# Altium footprint library YQPOWER.PcbLib: 215 footprints (part 1 of 14)
Each footprint in its own frame and in the unit in brackets; x right, y up, seen from the top. Pads: shape width x height; smd on the part's side, far side on the other; paste and mask are expansions set on the pad; w line width, h text height; cw(c..) or ccw(c..) is an arc to the next point about the centre after c.
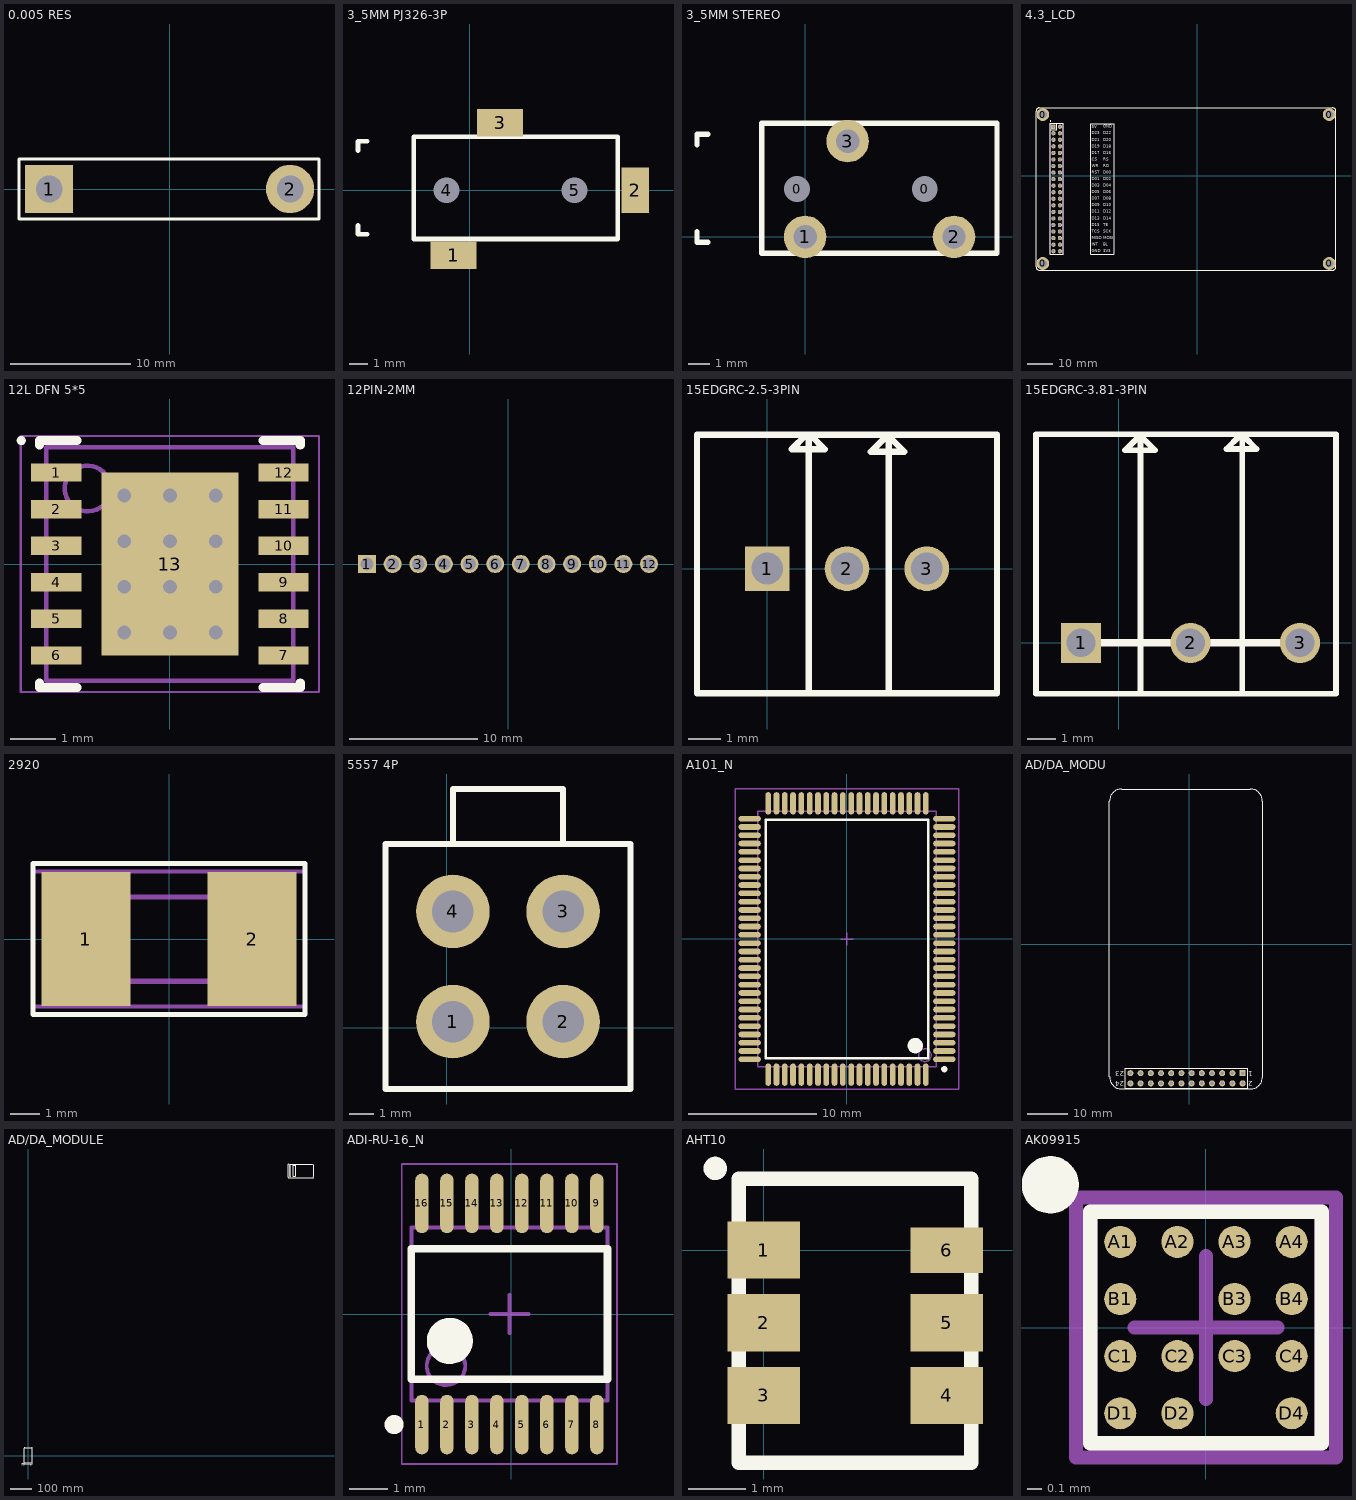
[diagram p0: the footprints below, top view; thin cyan lines are the x and y axes]

## 0.005 RES [mm]
pads (2):
  rect 4x4 hole 2.2: 1(-10,0)
  round 4 hole 2.2: 2(10,0)
Top Overlay:
  lines w0.254: -12.5,-2.5 12.4,-2.5 12.4,2.5 -12.5,2.5 -12.5,-2.5

## 3_5MM PJ326-3P [mil]
pads (5):
  rect 98.43x59.06 smd: 1(-35,-140) 3(65,145)
  rect 59.06x98.43 smd: 2(355,0)
  round 47 hole 55.12 unplated: 4(-50,0) 5(225,0)
Top Overlay:
  lines w10: -240.12,-75 -240.12,-95 -220.12,-95 ; -240.12,85 -240.12,105 -220.12,105 ; -120.12,-105 -120.12,-55 -120.12,115 48.62,115 317.81,115 317.81,-105 -120.12,-105

## 3_5MM STEREO [mm]
pads (5):
  round 0.8 hole 1.2: 0(-0.38,2.25) 0(5.62,2.25)
  round 2 hole 1.1: 1(0,0) 2(7,0) 3(2,4.5)
Top Overlay:
  lines w0.254: -5.08,0.254 -5.08,-0.254 -4.572,-0.254 ; -5.08,4.318 -5.08,4.826 -4.572,4.826 ; -2.032,5.334 -2.032,0.762 -2.032,-0.762 9.02,-0.762 9.02,0.632 9.02,4.5 9.02,5.334 2,5.334 -2.008,5.334

## 4.3_LCD [mm] "Connector; Header; 20x2 Position"
pads (48):
  round 0 hole 3: 0(-59.87,-34) 0(-59.87,23.7) 0(51.13,-34) 0(51.13,23.7)
  round 5 hole 3.2: 0(-59.87,-34) 0(-59.87,23.7) 0(51.13,-34) 0(51.13,23.7)
  rect 1.65x1.65 hole 1.016 mask+0: 1(-55.77,19)
  round 1.65 hole 1.016 mask+0: 2(-53.23,19) 3(-55.77,16.46) 4(-53.23,16.46) 5(-55.77,13.92) 6(-53.23,13.92) 7(-55.77,11.38) 8(-53.23,11.38) 9(-55.77,8.84) 10(-53.23,8.84) 11(-55.77,6.3) 12(-53.23,6.3) 13(-55.77,3.76) 14(-53.23,3.76) 15(-55.77,1.22) 16(-53.23,1.22) 17(-55.77,-1.32) 18(-53.23,-1.32) 19(-55.77,-3.86) 20(-53.23,-3.86) 21(-55.77,-6.4) 22(-53.23,-6.4) 23(-55.77,-8.94) 24(-53.23,-8.94) 25(-55.77,-11.48) 26(-53.23,-11.48) 27(-55.77,-14.02) 28(-53.23,-14.02) 29(-55.77,-16.56) 30(-53.23,-16.56) 31(-55.77,-19.1) 32(-53.23,-19.1) 33(-55.77,-21.64) 34(-53.23,-21.64) 35(-55.77,-24.18) 36(-53.23,-24.18) 37(-55.77,-26.72) 38(-53.23,-26.72) 39(-55.77,-29.26) 40(-53.23,-29.26)
Top Overlay:
  circle w0.25: c-56.9,21.17 r0.125
  lines w0.178: -57.04,17.73 -54.5,17.73 -54.5,20.27 ; -57.04,-30.53 -51.96,-30.53 -51.96,20.27 -57.04,20.27 -57.04,-30.53
  lines w0.2: -41.27,-30.5 -32.37,-30.5 -32.37,20.2 -41.27,20.2 -41.27,-30.5
  lines w0.254: -62.504,25 cw(c-61.17,25) -61.17,26.334 52.396,26.334 cw(c52.396,25) 53.73,25 53.73,-35.232 ; -62.47,24.966 -62.47,-35.3 ccw(c-61.136,-35.3) -61.136,-36.634 ; -61.102,-36.6 52.43,-36.6 ccw(c52.43,-35.266) 53.764,-35.266
  text "GND" at -40.978,-30.068 h2
  text "D15" at -40.978,-19.908 h2
  text "D07" at -40.978,-9.748 h2
  text "RST" at -40.978,0.412 h2
  text "D19" at -40.978,10.512 h2
  text "MISO" at -40.978,-24.988 h2
  text "INT" at -40.978,-27.528 h2
  text "D13" at -40.978,-17.368 h2
  text "TCS" at -40.97,-22.4 h2
  text "D09" at -40.978,-12.288 h2
  text "D11" at -40.978,-14.828 h2
  text "D01" at -40.978,-2.128 h2
  text "D03" at -40.978,-4.668 h2
  text "WR" at -40.978,2.952 h2
  text "CS" at -40.97,5.5 h2
  text "D23" at -40.978,15.592 h2
  text "D21" at -40.978,13.052 h2
  text "5V" at -40.97,18.1 h2
  text "D17" at -40.978,7.972 h2
  text "D05" at -40.978,-7.208 h2
  text "SCK" at -36.358,-22.448 h2
  text "D10" at -36.358,-12.288 h2
  text "D02" at -36.358,-2.128 h2
  text "D18" at -36.358,10.512 h2
  text "3V3" at -36.358,-30.068 h2
  text "BL" at -36.358,-27.528 h2
  text "D14" at -36.358,-17.368 h2
  text "TE" at -36.358,-19.908 h2
  text "D08" at -36.358,-9.748 h2
  text "D12" at -36.358,-14.828 h2
  text "D04" at -36.358,-4.668 h2
  text "D06" at -36.358,-7.208 h2
  text "RS" at -36.358,5.492 h2
  text "RD" at -36.358,2.952 h2
  text "D22" at -36.358,15.592 h2
  text "D20" at -36.358,13.052 h2
  text "GND" at -36.358,18.132 h2
  text "MOSI" at -36.358,-24.988 h2
  text "D16" at -36.358,7.972 h2
  text "D00" at -36.358,0.412 h2
Mechanical 5:
  region: -56.278,19.508 -56.278,18.492 -55.262,18.492 -55.262,19.508
  lines w0.127: -57.04,-30.53 -57.04,20.27 -51.96,20.27 -51.96,-30.53 -57.04,-30.53
  text ".Designator" at -55.008,-3.606 h1.02
3D body "SamtecTSW-07_20x2.stp": height 8.38, standoff -2.54, extent -57.04,-30.53 -51.96,20.27

## 12L DFN 5*5 [mm] "SON, 12-Leads, Body 5.00x5.35mm, Pitch 0.80mm, Thermal Pad 4.00x3.00mm, IPC Medium Density"
height 1
pads (13):
  rect 1.1x0.4 smd mask+0: 1(-2.485,2) 2(-2.485,1.2) 3(-2.485,0.4) 4(-2.485,-0.4) 5(-2.485,-1.2) 6(-2.485,-2) 7(2.485,-2) 8(2.485,-1.2) 9(2.485,-0.4) 10(2.485,0.4) 11(2.485,1.2) 12(2.485,2)
  rect 3x4 smd paste-1.5 mask+0: 13(0,0)
via -1,1.5 diameter 0.5 hole 0.3
via 0,1.5 diameter 0.5 hole 0.3
via 1,1.5 diameter 0.5 hole 0.3
via -1,0.5 diameter 0.5 hole 0.3
via 0,0.5 diameter 0.5 hole 0.3
via 1,0.5 diameter 0.5 hole 0.3
via -1,-0.5 diameter 0.5 hole 0.3
via 0,-0.5 diameter 0.5 hole 0.3
via 1,-0.5 diameter 0.5 hole 0.3
via -1,-1.5 diameter 0.5 hole 0.3
via 0,-1.5 diameter 0.5 hole 0.3
via 1,-1.5 diameter 0.5 hole 0.3
Top Overlay:
  circle w0.1: c-3.25,2.7 r0.05
  lines w0.2: -2.85,-2.6 -2.85,-2.7 -2.035,-2.7 ; -2.85,2.6 -2.85,2.7 -2.035,2.7 ; 2.035,-2.7 2.85,-2.7 2.85,-2.6 ; 2.035,2.7 2.85,2.7 2.85,2.6
Top Paste:
  rectangle: -1.4,0.765 -0.1,1.895
  rectangle: -1.4,-0.565 -0.1,0.565
  rectangle: -1.4,-1.895 -0.1,-0.765
  rectangle: 0.1,0.765 1.4,1.895
  rectangle: 0.1,-0.565 1.4,0.565
  rectangle: 0.1,-1.895 1.4,-0.765
Mechanical 13:
  circle w0.1: c-1.8,1.65 r0.5
  lines w0.1: -2.7,-2.55 -2.7,2.55 2.7,2.55 2.7,-2.55 -2.7,-2.55
Mechanical 15:
  lines w0.05: -3.26,-2.8 -3.26,2.8 3.26,2.8 3.26,-2.8 -3.26,-2.8
  lines w0.1: -0.5,0 0.5,0 ; 0,-0.5 0,0.5
3D body: height 1, standoff 0.1, extent -2.7,-2.55 2.7,2.55

## 12PIN-2MM [mm] "Samtec 100mil, 1x12, 230 mil above insulator"
height 8.382
pads (12):
  rect 1.4x1.4 hole 1 mask+0: 1(-11,0)
  round 1.4 hole 1 mask+0: 2(-9,0) 3(-7,0) 4(-5,0) 5(-3,0) 6(-1,0) 7(1,0) 8(3,0) 9(5,0) 10(7,0) 11(9,0) 12(11,0)

## 15EDGRC-2.5-3PIN [mm]
pads (3):
  rect 1.4x1.4 hole 1: 1(0,0)
  round 1.4 hole 1: 2(2.5,0) 3(5,0)
Top Overlay:
  lines w0.203: 1.295,-3.912 1.295,4.191 1.219,4.191 0.762,3.734 1.803,3.734 1.346,4.191 ; 3.708,4.115 3.251,3.658 4.293,3.658 3.835,4.115 ; 3.809,-3.835 3.809,4.2 ; -2.2,-3.9 7.2,-3.9 7.2,4.2 -2.2,4.2 -2.2,-3.9

## 15EDGRC-3.81-3PIN [mm]
pads (3):
  rect 1.4x1.4 hole 1: 1(-1.31,0)
  round 1.4 hole 1: 2(2.5,0) 3(6.31,0)
Top Overlay:
  lines w0.203: 0.756,-1.74 0.756,7.084 0.68,7.16 0.223,6.703 1.264,6.703 0.807,7.16 ; 4.209,7.207 3.752,6.75 4.794,6.75 4.336,7.207 ; 4.299,-1.69 4.299,7.207 ; -2.88,-1.77 -2.88,7.26 7.56,7.26 7.56,-1.77 -2.88,-1.77
  lines w0.254: -1.31,0 2.5,0 6.31,0

## 2920 [mm] "Cooper Bussman 6125FA Brick Fuses, recommended land pattern OC-2531 Rev. I 3/07"
height 2.84
pads (2):
  rect 3x4.5 smd: 1(-2.8,0) 2(2.8,0)
Top Overlay:
  lines w0.178: -4.575,-2.54 4.575,-2.54 4.575,2.54 -4.575,2.54 -4.575,-2.54
Mechanical 5:
  lines w0.127: -4.575,-2.275 -4.575,2.275 4.575,2.275 4.575,-2.25 4.55,-2.275 -4.575,-2.275
  text ".Designator" at -1.725,-0.525 h1.02
Mechanical 13:
  lines w0.178: -1.825,-1.425 -1.825,1.415 ; 1.825,-1.425 1.825,1.415 ; -3.175,-1.425 3.175,-1.425 3.175,1.415 -3.175,1.415 -3.175,-1.425
3D body: height 2.84, standoff 0, extent -3.174,-1.424 -1.826,1.414
3D body: height 2.84, standoff 0, extent -1.824,-1.424 1.824,1.414
3D body: height 2.84, standoff 0, extent 1.826,-1.424 3.174,1.414

## 5557 4P [mm] "Samtec 100mil, 1x4, 230 mil above insulator"
height 8.382
pads (4):
  round 3 hole 1.7: 1(0.25,0.25) 2(4.75,0.25) 3(4.75,4.75) 4(0.25,4.75)
Top Overlay:
  lines w0.254: 0.25,7.5 0.25,9.75 4.75,9.75 4.75,7.5 ; -2.5,-2.5 7.5,-2.5 7.5,7.5 -2.5,7.5 -2.5,-2.5

## A101_N [mm] "100pin"
pads (100):
  oval 1.75x0.45 smd: 1(7.641,-9.433) 2(7.641,-8.783) 3(7.641,-8.133) 4(7.641,-7.483) 5(7.641,-6.833) 6(7.641,-6.183) 7(7.641,-5.533) 8(7.641,-4.883) 9(7.641,-4.233) 10(7.641,-3.583) 11(7.641,-2.933) 12(7.641,-2.283) 13(7.641,-1.633) 14(7.641,-0.983) 15(7.641,-0.333) 16(7.641,0.317) 17(7.641,0.967) 18(7.641,1.617) 19(7.641,2.267) 20(7.641,2.917) 21(7.641,3.567) 22(7.641,4.217) 23(7.641,4.867) 24(7.641,5.517) 25(7.641,6.167) 26(7.641,6.817) 27(7.641,7.467) 28(7.641,8.117) 29(7.641,8.767) 30(7.641,9.417) 51(-7.609,9.417) 52(-7.609,8.767) 53(-7.609,8.117) 54(-7.609,7.467) 55(-7.609,6.817) 56(-7.609,6.167) 57(-7.609,5.517) 58(-7.609,4.867) 59(-7.609,4.217) 60(-7.609,3.567) 61(-7.609,2.917) 62(-7.609,2.267) 63(-7.609,1.617) 64(-7.609,0.967) 65(-7.609,0.317) 66(-7.609,-0.333) 67(-7.609,-0.983) 68(-7.609,-1.633) 69(-7.609,-2.283) 70(-7.609,-2.933) 71(-7.609,-3.583) 72(-7.609,-4.233) 73(-7.609,-4.883) 74(-7.609,-5.533) 75(-7.609,-6.183) 76(-7.609,-6.833) 77(-7.609,-7.483) 78(-7.609,-8.133) 79(-7.609,-8.783) 80(-7.609,-9.433)
  oval 0.45x1.75 smd: 31(6.191,10.617) 32(5.541,10.617) 33(4.891,10.617) 34(4.241,10.617) 35(3.591,10.617) 36(2.941,10.617) 37(2.291,10.617) 38(1.641,10.617) 39(0.991,10.617) 40(0.341,10.617) 41(-0.309,10.617) 42(-0.959,10.617) 43(-1.609,10.617) 44(-2.259,10.617) 45(-2.909,10.617) 46(-3.559,10.617) 47(-4.209,10.617) 48(-4.859,10.617) 49(-5.509,10.617) 50(-6.159,10.617) 81(-6.159,-10.633) 82(-5.509,-10.633) 83(-4.859,-10.633) 84(-4.209,-10.633) 85(-3.559,-10.633) 86(-2.909,-10.633) 87(-2.259,-10.633) 88(-1.609,-10.633) 89(-0.959,-10.633) 90(-0.309,-10.633) 91(0.341,-10.633) 92(0.991,-10.633) 93(1.641,-10.633) 94(2.291,-10.633) 95(2.941,-10.633) 96(3.591,-10.633) 97(4.241,-10.633) 98(4.891,-10.633) 99(5.541,-10.633) 100(6.191,-10.633)
Top Overlay:
  circle w0.25: c7.641,-10.208 r0.125
  circle w0.6: c5.366,-8.358 r0.3
  lines w0.2: -6.334,-9.358 -6.334,9.342 6.366,9.342 6.366,-9.358 -6.334,-9.358
Mechanical 13:
  circle w0.1: c6.116,-9.108 r0.5
  lines w0.1: -6.984,-10.008 -6.984,9.992 7.016,9.992 7.016,-10.008 -6.984,-10.008
Mechanical 15:
  lines w0.1: -0.484,-0.008 0.516,-0.008 ; 0.016,-0.508 0.016,0.492 ; -8.734,-11.758 -8.734,11.742 8.766,11.742 8.766,-11.758 -8.734,-11.758
3D body: height 1.6, standoff 0, extent -6.984,-10.008 7.016,9.992

## AD/DA_MODU [mm]
pads (24):
  rect 1.5x1.5 hole 0.9: 1(13.25,-32.08)
  round 1.5 hole 0.9: 2(13.25,-34.62) 3(10.71,-32.08) 4(10.71,-34.62) 5(8.17,-32.08) 6(8.17,-34.62) 7(5.63,-32.08) 8(5.63,-34.62) 9(3.09,-32.08) 10(3.09,-34.62) 11(0.55,-32.08) 12(0.55,-34.62) 13(-1.99,-32.08) 14(-1.99,-34.62) 15(-4.53,-32.08) 16(-4.53,-34.62) 17(-7.07,-32.08) 18(-7.07,-34.62) 19(-9.61,-32.08) 20(-9.61,-34.62) 21(-12.15,-32.08) 22(-12.15,-34.62) 23(-14.69,-32.08) 24(-14.69,-34.62)
Top Overlay:
  lines w0.2: -15.96,-35.89 -15.96,-30.81 14.52,-30.81 14.52,-35.89 -15.96,-35.89
  lines w0.254: -19.9,-32.948 -19.9,35.659 cw(c-16.887,35.626) -16.854,38.639 ; -19.877,-32.971 ccw(c-16.864,-33.004) -16.897,-36.017 15.14,-36.017 ; -16.834,38.659 15.203,38.659 cw(c15.17,35.646) 18.183,35.613 ; 15.16,-35.997 ccw(c15.193,-32.984) 18.206,-33.017 18.206,35.59
  text "1" at 15.79,-31.572 h1.27
  text "2" at 15.79,-34.112 h1.27
  text "23" at -16.214,-31.572 h1.27
  text "24" at -16.214,-34.112 h1.27

## AD/DA_MODULE [mm] "Connector; Header; 20x2 Position"
pads (68):
  round 0 hole 3: 0(1192.11,1275.67) 0(1192.11,1333.37) 0(1303.11,1275.67) 0(1303.11,1333.37)
  rect 1.5x1.5 hole 0.9: 1(13.36,-32.77)
  rect 1.65x1.65 hole 1.016 mask+0: 1(1196.21,1328.67)
  round 1.5 hole 0.9: 2(13.36,-35.31) 3(10.82,-32.77) 4(10.82,-35.31) 5(8.28,-32.77) 6(8.28,-35.31) 7(5.74,-32.77) 8(5.74,-35.31) 9(3.2,-32.77) 10(3.2,-35.31) 11(0.66,-32.77) 12(0.66,-35.31) 13(-1.88,-32.77) 14(-1.88,-35.31) 15(-4.42,-32.77) 16(-4.42,-35.31) 17(-6.96,-32.77) 18(-6.96,-35.31) 19(-9.5,-32.77) 20(-9.5,-35.31) 21(-12.04,-32.77) 22(-12.04,-35.31) 23(-14.58,-32.77) 24(-14.58,-35.31)
  round 1.65 hole 1.016 mask+0: 2(1198.75,1328.67) 3(1196.21,1326.13) 4(1198.75,1326.13) 5(1196.21,1323.59) 6(1198.75,1323.59) 7(1196.21,1321.05) 8(1198.75,1321.05) 9(1196.21,1318.51) 10(1198.75,1318.51) 11(1196.21,1315.97) 12(1198.75,1315.97) 13(1196.21,1313.43) 14(1198.75,1313.43) 15(1196.21,1310.89) 16(1198.75,1310.89) 17(1196.21,1308.35) 18(1198.75,1308.35) 19(1196.21,1305.81) 20(1198.75,1305.81) 21(1196.21,1303.27) 22(1198.75,1303.27) 23(1196.21,1300.73) 24(1198.75,1300.73) 25(1196.21,1298.19) 26(1198.75,1298.19) 27(1196.21,1295.65) 28(1198.75,1295.65) 29(1196.21,1293.11) 30(1198.75,1293.11) 31(1196.21,1290.57) 32(1198.75,1290.57) 33(1196.21,1288.03) 34(1198.75,1288.03) 35(1196.21,1285.49) 36(1198.75,1285.49) 37(1196.21,1282.95) 38(1198.75,1282.95) 39(1196.21,1280.41) 40(1198.75,1280.41)
Top Overlay:
  circle w0.25: c1195.08,1330.84 r0.125
  lines w0.178: 1194.94,1327.4 1197.48,1327.4 1197.48,1329.94 ; 1194.94,1279.14 1194.94,1329.94 1200.02,1329.94 1200.02,1279.14 1194.94,1279.14
  lines w0.2: -15.85,-36.58 14.63,-36.58 14.63,-31.5 -15.85,-31.5 -15.85,-36.58 ; 1210.71,1279.17 1210.71,1329.87 1219.61,1329.87 1219.61,1279.17 1210.71,1279.17
  lines w0.254: -19.79,-33.638 -19.79,34.969 cw(c-16.777,34.936) -16.744,37.949 ; -19.767,-33.661 ccw(c-16.754,-33.694) -16.787,-36.707 15.25,-36.707 ; -16.724,37.969 15.313,37.969 cw(c15.28,34.956) 18.293,34.923 ; 15.27,-36.687 ccw(c15.303,-33.674) 18.316,-33.707 18.316,34.9 ; 1189.476,1334.67 cw(c1190.81,1334.67) 1190.81,1336.004 1304.376,1336.004 cw(c1304.376,1334.67) 1305.71,1334.67 1305.71,1274.438 ; 1189.51,1334.636 1189.51,1274.37 ccw(c1190.844,1274.37) 1190.844,1273.036 ; 1190.878,1273.07 1304.41,1273.07 ccw(c1304.41,1274.404) 1305.744,1274.404
  text "24" at -16.104,-34.802 h1.27
  text "23" at -16.104,-32.262 h1.27
  text "2" at 15.9,-34.802 h1.27
  text "1" at 15.9,-32.262 h1.27
Mechanical 5:
  region: 1195.702,1329.178 1195.702,1328.162 1196.718,1328.162 1196.718,1329.178
  lines w0.127: 1194.94,1279.14 1200.02,1279.14 1200.02,1329.94 1194.94,1329.94 1194.94,1279.14
  text ".Designator" at 1196.972,1306.064 h1.02

## ADI-RU-16_N [mm]
pads (16):
  oval 0.35x1.55 smd: 1(-2.326,-2.875) 2(-1.676,-2.875) 3(-1.026,-2.875) 4(-0.376,-2.875) 5(0.274,-2.875) 6(0.924,-2.875) 7(1.574,-2.875) 8(2.224,-2.875) 9(2.224,2.875) 10(1.574,2.875) 11(0.924,2.875) 12(0.274,2.875) 13(-0.376,2.875) 14(-1.026,2.875) 15(-1.676,2.875) 16(-2.326,2.875)
Top Overlay:
  circle w0.6: c-1.601,-0.7 r0.3
  circle w0.25: c-3.051,-2.875 r0.125
  lines w0.2: -2.601,-1.7 -2.601,1.7 2.499,1.7 2.499,-1.7 -2.601,-1.7
Mechanical 13:
  circle w0.1: c-1.701,-1.35 r0.5
  lines w0.1: -2.601,-2.25 -2.601,2.25 2.499,2.25 2.499,-2.25 -2.601,-2.25
Mechanical 15:
  lines w0.05: -2.851,-3.9 -2.851,3.9 2.749,3.9 2.749,-3.9 -2.851,-3.9
  lines w0.1: -0.551,0 0.449,0 ; -0.051,-0.5 -0.051,0.5
3D body: height 1.2, standoff 0.05, extent -2.601,-2.25 2.499,2.25

## AHT10 [mm] "Fairchild OptoCoupler"
height 2.4
pads (6):
  rect 1.27x1 smd: 1(0,0) 2(0,-1.27) 3(0,-2.54) 4(3.2,-2.54) 5(3.2,-1.27)
  rect 1.27x0.8 smd: 6(3.2,0)
Top Overlay:
  circle w0.254: c-0.85,1.43 r0.077
  lines w0.254: -0.44,-3.72 -0.44,1.25 3.63,1.25 3.63,-3.72 -0.44,-3.72
Mechanical 5:
  lines w0.102: -0.412,-3.74 -0.412,1.258 3.652,1.258 3.652,-3.74 -0.412,-3.74
3D body: height 2.4, standoff 0, extent -0.45,-3.74 3.78,1.254

## AK09915 [mm] "Micro SMD, 16-Leads, Body 1.62x1.62mm, Pitch 0.4mm, NSC Recommended"
height 0.68
pads (14):
  round 0.225 smd paste-0.112 mask+0.05: A1(-0.6,0.6) A2(-0.2,0.6) A3(0.2,0.6) A4(0.6,0.6) B1(-0.6,0.2) B3(0.2,0.2) B4(0.6,0.2) C1(-0.6,-0.2) C2(-0.2,-0.2) C3(0.2,-0.2) C4(0.6,-0.2) D1(-0.6,-0.6) D2(-0.2,-0.6) D4(0.6,-0.6)
Top Overlay:
  circle w0.2: c-1.09,1 r0.1
  lines w0.1: -0.81,-0.81 -0.81,0.81 0.81,0.81 0.81,-0.81 -0.81,-0.81
Top Paste:
  circle w0.05: c-0.125,-0.275 r0.025
  circle w0.05: c-0.275,-0.125 r0.025
  circle w0.05: c-0.275,-0.275 r0.025
  circle w0.05: c-0.125,-0.125 r0.025
  circle w0.05: c-0.125,0.55 r0.025
  circle w0.05: c-0.275,0.7 r0.025
  circle w0.05: c-0.275,0.55 r0.025
  circle w0.05: c-0.125,0.7 r0.025
  circle w0.05: c0.275,0.55 r0.025
  circle w0.05: c0.125,0.7 r0.025
  circle w0.05: c0.125,0.55 r0.025
  circle w0.05: c0.275,0.7 r0.025
  circle w0.05: c0.55,0.125 r0.025
  circle w0.05: c0.7,0.275 r0.025
  circle w0.05: c0.55,0.275 r0.025
  circle w0.05: c0.7,0.125 r0.025
  circle w0.05: c0.55,-0.275 r0.025
  circle w0.05: c0.7,-0.125 r0.025
  circle w0.05: c0.55,-0.125 r0.025
  circle w0.05: c0.7,-0.275 r0.025
  circle w0.05: c-0.275,-0.55 r0.025
  circle w0.05: c-0.125,-0.7 r0.025
  circle w0.05: c-0.125,-0.55 r0.025
  circle w0.05: c-0.275,-0.7 r0.025
  circle w0.05: c-0.55,-0.125 r0.025
  circle w0.05: c-0.7,-0.275 r0.025
  circle w0.05: c-0.55,-0.275 r0.025
  circle w0.05: c-0.7,-0.125 r0.025
  circle w0.05: c-0.55,0.275 r0.025
  circle w0.05: c-0.7,0.125 r0.025
  circle w0.05: c-0.55,0.125 r0.025
  circle w0.05: c-0.7,0.275 r0.025
  circle w0.05: c0.55,-0.55 r0.025
  circle w0.05: c0.7,-0.7 r0.025
  circle w0.05: c0.7,-0.55 r0.025
  circle w0.05: c0.55,-0.7 r0.025
  circle w0.05: c-0.55,-0.55 r0.025
  circle w0.05: c-0.7,-0.7 r0.025
  circle w0.05: c-0.7,-0.55 r0.025
  circle w0.05: c-0.55,-0.7 r0.025
  circle w0.05: c-0.55,0.55 r0.025
  circle w0.05: c-0.7,0.7 r0.025
  circle w0.05: c-0.7,0.55 r0.025
  circle w0.05: c-0.55,0.7 r0.025
  circle w0.05: c0.55,0.55 r0.025
  circle w0.05: c0.7,0.7 r0.025
  circle w0.05: c0.7,0.55 r0.025
  circle w0.05: c0.55,0.7 r0.025
  circle w0.05: c0.125,-0.275 r0.025
  circle w0.05: c0.275,-0.125 r0.025
  circle w0.05: c0.275,-0.275 r0.025
  circle w0.05: c0.125,-0.125 r0.025
  circle w0.05: c0.125,0.125 r0.025
  circle w0.05: c0.275,0.275 r0.025
  circle w0.05: c0.275,0.125 r0.025
  circle w0.05: c0.125,0.275 r0.025
  region: -0.275,-0.125 -0.275,-0.275 -0.125,-0.275 -0.125,-0.125
  region: -0.075,-0.275 -0.075,-0.125 -0.125,-0.125 -0.125,-0.275
  region: -0.125,-0.075 -0.275,-0.075 -0.275,-0.125 -0.125,-0.125
  region: -0.325,-0.125 -0.325,-0.275 -0.275,-0.275 -0.275,-0.125
  rectangle: -0.275,-0.325 -0.125,-0.275
  region: -0.275,0.7 -0.275,0.55 -0.125,0.55 -0.125,0.7
  region: -0.075,0.55 -0.075,0.7 -0.125,0.7 -0.125,0.55
  region: -0.125,0.75 -0.275,0.75 -0.275,0.7 -0.125,0.7
  region: -0.325,0.7 -0.325,0.55 -0.275,0.55 -0.275,0.7
  rectangle: -0.275,0.5 -0.125,0.55
  region: 0.125,0.7 0.125,0.55 0.275,0.55 0.275,0.7
  region: 0.325,0.55 0.325,0.7 0.275,0.7 0.275,0.55
  region: 0.275,0.75 0.125,0.75 0.125,0.7 0.275,0.7
  region: 0.075,0.7 0.075,0.55 0.125,0.55 0.125,0.7
  rectangle: 0.125,0.5 0.275,0.55
  region: 0.7,0.275 0.55,0.275 0.55,0.125 0.7,0.125
  rectangle: 0.55,0.075 0.7,0.125
  region: 0.75,0.125 0.75,0.275 0.7,0.275 0.7,0.125
  region: 0.7,0.325 0.55,0.325 0.55,0.275 0.7,0.275
  region: 0.5,0.275 0.5,0.125 0.55,0.125 0.55,0.275
  region: 0.7,-0.125 0.55,-0.125 0.55,-0.275 0.7,-0.275
  rectangle: 0.55,-0.325 0.7,-0.275
  region: 0.75,-0.275 0.75,-0.125 0.7,-0.125 0.7,-0.275
  region: 0.7,-0.075 0.55,-0.075 0.55,-0.125 0.7,-0.125
  region: 0.5,-0.125 0.5,-0.275 0.55,-0.275 0.55,-0.125
  region: -0.125,-0.7 -0.125,-0.55 -0.275,-0.55 -0.275,-0.7
  region: -0.325,-0.55 -0.325,-0.7 -0.275,-0.7 -0.275,-0.55
  rectangle: -0.275,-0.75 -0.125,-0.7
  region: -0.075,-0.7 -0.075,-0.55 -0.125,-0.55 -0.125,-0.7
  region: -0.125,-0.5 -0.275,-0.5 -0.275,-0.55 -0.125,-0.55
  rectangle: -0.7,-0.275 -0.55,-0.125
  region: -0.55,-0.075 -0.7,-0.075 -0.7,-0.125 -0.55,-0.125
  region: -0.75,-0.125 -0.75,-0.275 -0.7,-0.275 -0.7,-0.125
  rectangle: -0.7,-0.325 -0.55,-0.275
  region: -0.5,-0.275 -0.5,-0.125 -0.55,-0.125 -0.55,-0.275
  rectangle: -0.7,0.125 -0.55,0.275
  region: -0.55,0.325 -0.7,0.325 -0.7,0.275 -0.55,0.275
  region: -0.75,0.275 -0.75,0.125 -0.7,0.125 -0.7,0.275
  rectangle: -0.7,0.075 -0.55,0.125
  region: -0.5,0.125 -0.5,0.275 -0.55,0.275 -0.55,0.125
  region: 0.7,-0.7 0.7,-0.55 0.55,-0.55 0.55,-0.7
  region: 0.5,-0.55 0.5,-0.7 0.55,-0.7 0.55,-0.55
  rectangle: 0.55,-0.75 0.7,-0.7
  region: 0.75,-0.7 0.75,-0.55 0.7,-0.55 0.7,-0.7
  region: 0.7,-0.5 0.55,-0.5 0.55,-0.55 0.7,-0.55
  region: -0.55,-0.7 -0.55,-0.55 -0.7,-0.55 -0.7,-0.7
  region: -0.55,-0.55 -0.55,-0.7 -0.5,-0.7 -0.5,-0.55
  region: -0.55,-0.7 -0.7,-0.7 -0.7,-0.75 -0.55,-0.75
  region: -0.7,-0.7 -0.7,-0.55 -0.75,-0.55 -0.75,-0.7
  rectangle: -0.7,-0.55 -0.55,-0.5
  region: -0.7,0.7 -0.7,0.55 -0.55,0.55 -0.55,0.7
  region: -0.5,0.55 -0.5,0.7 -0.55,0.7 -0.55,0.55
  region: -0.55,0.75 -0.7,0.75 -0.7,0.7 -0.55,0.7
  region: -0.75,0.7 -0.75,0.55 -0.7,0.55 -0.7,0.7
  rectangle: -0.7,0.5 -0.55,0.55
  region: 0.55,0.7 0.55,0.55 0.7,0.55 0.7,0.7
  region: 0.55,0.55 0.55,0.7 0.5,0.7 0.5,0.55
  rectangle: 0.55,0.7 0.7,0.75
  region: 0.7,0.7 0.7,0.55 0.75,0.55 0.75,0.7
  region: 0.7,0.55 0.55,0.55 0.55,0.5 0.7,0.5
  region: 0.275,-0.075 0.125,-0.075 0.125,-0.125 0.275,-0.125
  region: 0.325,-0.275 0.325,-0.125 0.275,-0.125 0.275,-0.275
  rectangle: 0.125,-0.325 0.275,-0.275
  region: 0.075,-0.125 0.075,-0.275 0.125,-0.275 0.125,-0.125
  region: 0.275,-0.275 0.275,-0.125 0.125,-0.125 0.125,-0.275
  region: 0.275,0.325 0.125,0.325 0.125,0.275 0.275,0.275
  region: 0.325,0.125 0.325,0.275 0.275,0.275 0.275,0.125
  rectangle: 0.125,0.075 0.275,0.125
  region: 0.075,0.275 0.075,0.125 0.125,0.125 0.125,0.275
  region: 0.275,0.125 0.275,0.275 0.125,0.275 0.125,0.125
Mechanical 5:
  lines w0.1: -0.81,-0.81 -0.81,0.81 0.81,0.81 0.81,-0.81 -0.81,-0.81
Mechanical 15:
  lines w0.1: -0.5,0 0.5,0 ; 0,-0.5 0,0.5 ; -0.91,-0.91 -0.91,0.91 0.91,0.91 0.91,-0.91 -0.91,-0.91